# Altium footprint library UserLibrary.PcbLib: 41 footprints (part 1 of 3)
Each footprint in its own frame and in the unit in brackets; x right, y up, seen from the top. Pads: shape width x height; smd on the part's side, far side on the other; paste and mask are expansions set on the pad; w line width, h text height; cw(c..) or ccw(c..) is an arc to the next point about the centre after c.
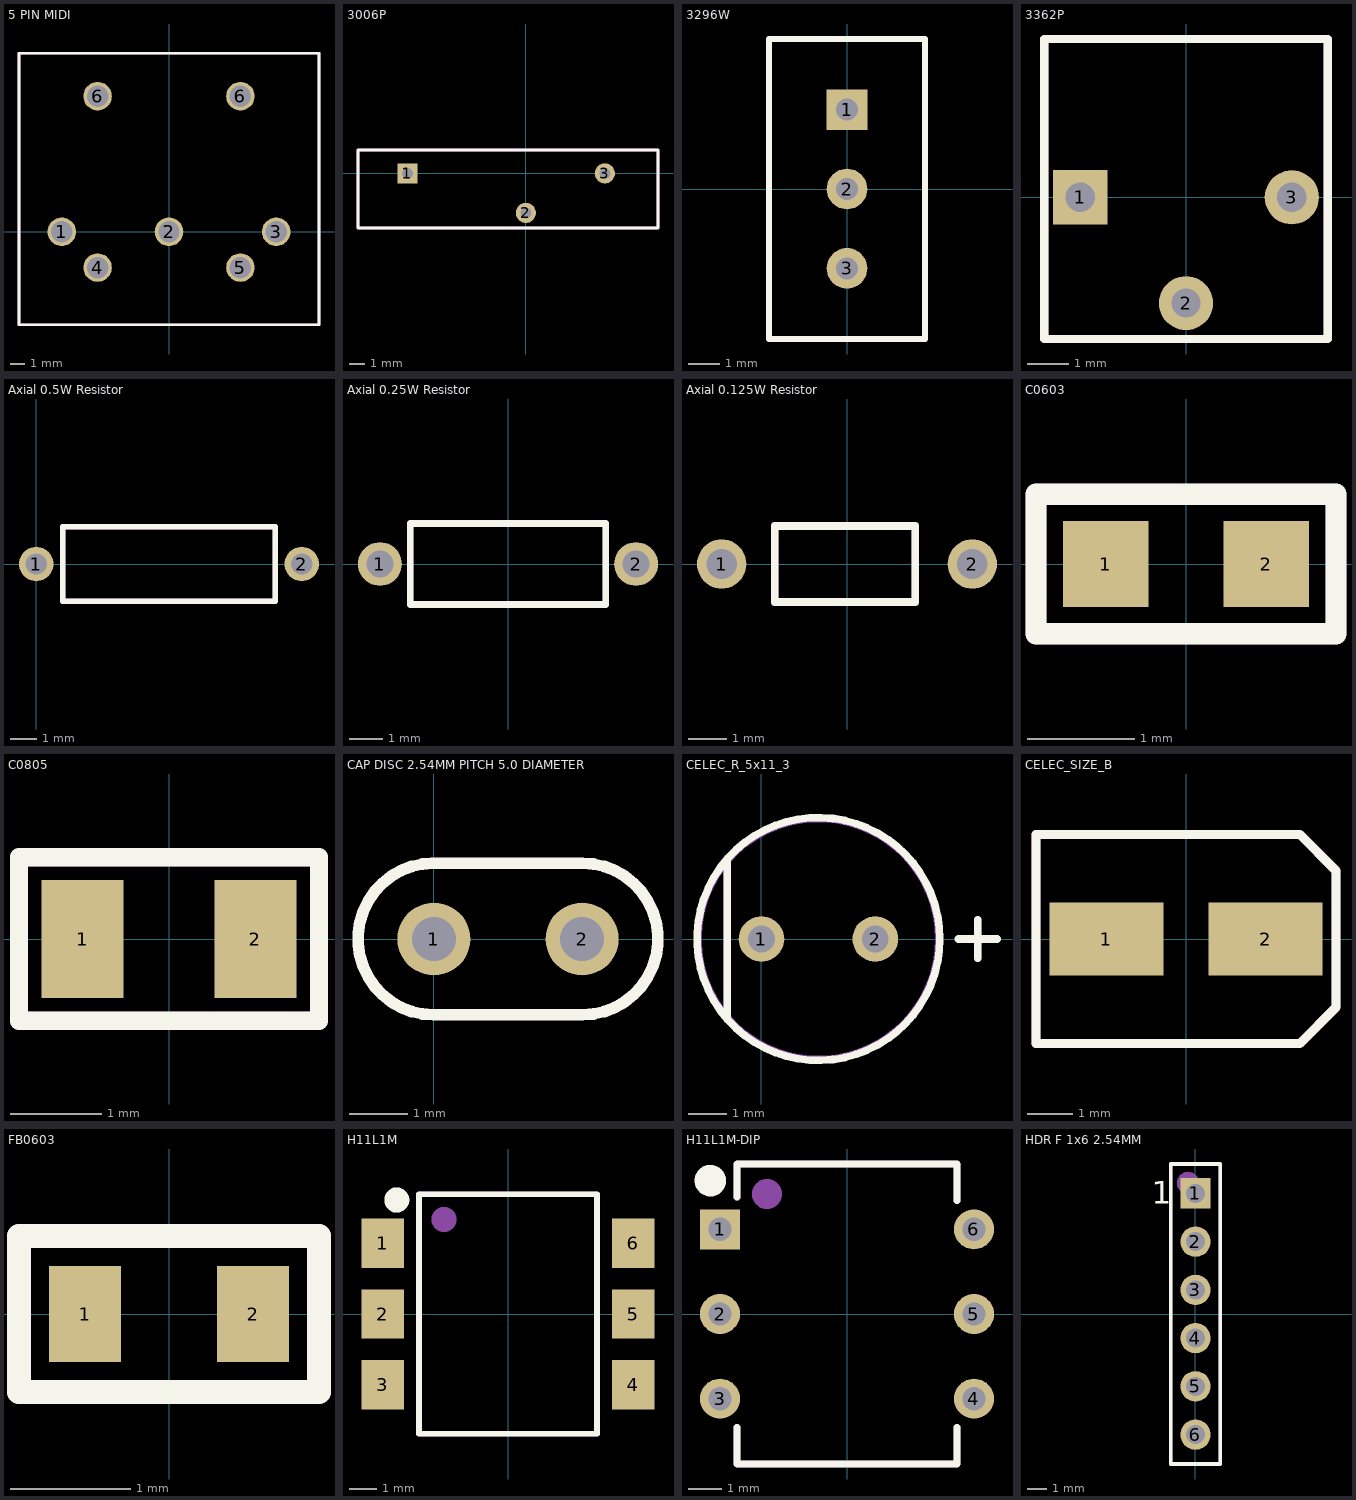
[diagram p0: the footprints below, top view; thin cyan lines are the x and y axes]

## 5 PIN MIDI [mm]
pads (7):
  round 2 hole 1.5: 1(-7.5,0) 2(0,0) 3(7.5,0) 4(-5,-2.5) 5(5,-2.5) 6(-5,9.5) 6(5,9.5)
Top Overlay:
  lines w0.2: -10.5,-6.5 -10.5,12.5 10.5,12.5 10.5,-6.5 -10.5,-6.5
Mechanical 29:
  lines w0.2: -10.5,-6.5 -10.5,12.5 10.5,12.5 10.5,-6.5 -10.5,-6.5
  text ".Designator" at -3.3,3.1 h1.2
3D body "DIN-5.STEP": height 19.51, standoff -2.79, extent -10.6,-6.514 10.6,12.5

## 3006P [mm]
pads (3):
  rect 1.3x1.3 hole 0.7: 1(-7.62,0)
  round 1.3 hole 0.7: 2(0,-2.54) 3(5.08,0)
Top Overlay:
  lines w0.2: -10.8,-3.5 8.5,-3.5 8.5,1.5 -10.8,1.5 -10.8,-3.5
Mechanical 29:
  lines w0.2: -10.8,-3.5 -10.8,1.5 8.5,1.5 8.5,-3.5 -10.8,-3.5
  text ".Designator" at -4.5,-1.2 h1.2
3D body "3006P.step": height 6.36, standoff -1.89, extent -10.665,-3.43 9.905,1.4

## 3296W [mm]
pads (3):
  rect 1.3x1.3 hole 0.7: 1(0,2.54)
  round 1.3 hole 0.7: 2(0,0) 3(0,-2.54)
Top Overlay:
  lines w0.2: -2.5,-4.8 2.5,-4.8 2.5,4.8 -2.5,4.8 -2.5,-4.8
Mechanical 29:
  lines w0.2: -2.5,-4.8 -2.5,4.8 2.5,4.8 2.5,-4.8 -2.5,-4.8
  text ".Designator" at 0.6,-2.3 h1.2
3D body "3296W.STEP": height 11.56, standoff -7.61, extent -2.415,-4.765 2.415,4.765

## 3362P [mm]
pads (3):
  rect 1.3x1.3 hole 0.7: 1(-2.54,0)
  round 1.3 hole 0.7: 2(0,-2.54) 3(2.54,0)
Top Overlay:
  lines w0.2: -3.4,-3.4 3.4,-3.4 3.4,3.8 -3.4,3.8 -3.4,-3.4
Mechanical 29:
  lines w0.2: -3.4,-3.4 -3.4,3.8 3.4,3.8 3.4,-3.4 -3.4,-3.4
  text ".Designator" at 0.6,-2.3 h1.2
3D body "3362P.STEP": height 4.7, standoff -5.47, extent -3.3,-3.3 3.3,3.754

## Axial 0.5W Resistor [mm]
pads (2):
  round 1.3 hole 0.8: 1(0,0) 2(10,0)
Top Overlay:
  lines w0.2: 1,-1.4 9,-1.4 9,1.4 1,1.4 1,-1.4
Mechanical 29:
  lines w0.2: 1,-1.4 1,1.4 9,1.4 9,-1.4 1,-1.4
  text ".Designator" at 3.4,-0.5 h1.2
3D body "RESAD1000W56L850D270-000-300_SEI_CF12.STEP": height 2.7, standoff -3, extent -0.28,-1.35 10.28,1.35

## Axial 0.25W Resistor [mm]
pads (2):
  round 1.3 hole 0.8: 1(-3.8,0) 2(3.8,0)
Top Overlay:
  lines w0.2: -2.9,-1.2 -2.9,1.2 2.9,1.2 2.9,-1.2 -2.9,-1.2
Mechanical 29:
  lines w0.2: -2.9,-1.2 -2.9,1.2 2.9,1.2 2.9,-1.2 -2.9,-1.2
  text ".Designator" at -2,-0.6 h1.2
3D body "R-Axial-0_25W-7_62.step": height 2.5, standoff -3.7, extent -4.11,-1.203 4.11,1.203

## Axial 0.125W Resistor [mm]
pads (2):
  round 1.3 hole 0.8: 1(-3.3,0) 2(3.3,0)
Top Overlay:
  lines w0.2: -1.9,-1 1.8,-1 1.8,1 -1.9,1 -1.9,-1
Mechanical 29:
  lines w0.2: -1.9,-1 1.8,-1 1.8,1 -1.9,1 -1.9,-1
  text ".Designator" at -2,-0.6 h1.2
3D body "RES-AXIAL-L3.6-D1.9-DA0.5-Pitch6.6-Blue.step": height 1.95, standoff -3, extent -3.55,-0.948 3.55,0.948

## C0603 [mm]
pads (2):
  rect 0.8x0.8 smd: 1(-0.75,0) 2(0.75,0)
Top Overlay:
  lines w0.2: -1.4,-0.65 -1.4,0.65 1.4,0.65 1.4,-0.65 -1.4,-0.65
Mechanical 29:
  lines w0.2: -1.4,-0.65 1.4,-0.65 1.4,0.65 -1.4,0.65 -1.4,-0.65
  text ".Designator" at -0.925,-0.275 h0.6
3D body "CAPC1608X95N EIA 0603.step": height 0.96, standoff 0.01, extent -0.8,-0.4 0.8,0.4

## C0805 [mm]
pads (2):
  rect 0.9x1.3 smd: 1(-0.95,0) 2(0.95,0)
Top Overlay:
  lines w0.2: -1.65,-0.9 1.65,-0.9 1.65,0.9 -1.65,0.9 -1.65,-0.9
Mechanical 29:
  lines w0.2: -1.65,-0.9 -1.65,0.9 1.65,0.9 1.65,-0.9 -1.65,-0.9
  text ".Designator" at -0.9,-0.2 h0.6
3D body "CAPC2012X90N EIA 0805.step": height 0.91, standoff 0.01, extent -1,-0.6 1,0.6

## CAP DISC 2.54MM PITCH 5.0 DIAMETER [mm]
pads (2):
  round 1.25 hole 0.75: 1(0,0) 2(2.54,0)
Top Overlay:
  lines w0.2: -0.04,1.3 2.5,1.3 ; 0,1.3 ccw(c0,0) 0,-1.3 2.54,-1.3 ccw(c2.54,0) 2.54,1.3
Mechanical 29:
  text ".Designator" at -0.5,-1.1 h1.2
3D body "Ceramic Disc 2.54 pitch 4.5 diameter.STEP": height 4.57, standoff -3, extent -0.898,-1.03 3.498,1.049

## CELEC_R_5x11_3 [mm]
pads (2):
  round 1.2 hole 0.7: 1(0,0) 2(3,0)
Top Overlay:
  circle w0.2: c1.5,0 r3.2
  lines w0.2: -0.9,-2.1 -0.9,2.1 ; 5.192,0 6.208,0 ; 5.7,-0.508 5.7,0.508
Mechanical 29:
  circle w0.2: c1.5,0 r3.178
  lines w0.2: -0.9,-2 -0.9,2 ; 5.2,0 6.2,0 ; 5.7,-0.5 5.7,0.5
  text ".Designator" at 0.9,-1.2 h1.2
3D body "Cap-EL(6_3x12-2_5).step": height 12, standoff -3.2, extent -1.652,-3.149 4.65,3.149

## CELEC_SIZE_B [mm]
pads (2):
  rect 2.5x1.6 smd: 1(-1.75,0) 2(1.75,0)
Top Overlay:
  lines w0.2: -3.3,-2.3 2.5,-2.3 3.3,-1.5 3.3,1.5 2.5,2.3 -3.3,2.3 -3.3,-2.3
Mechanical 29:
  lines w0.2: -3.3,-2.3 2.5,-2.3 3.3,-1.5 3.3,1.5 2.5,2.3 -3.3,2.3 -3.3,-2.3
  text ".Designator" at -1.9,-0.6 h1.2
3D body "CELEC_SIZE_B.stp": height 5.81, standoff 0.01, extent -2.5,-2.15 2.5,2.15

## FB0603 [mm]
pads (2):
  rect 0.6x0.8 smd: 1(-0.7,0) 2(0.7,0)
Top Overlay:
  lines w0.2: -1.25,-0.65 1.25,-0.65 1.25,0.65 -1.25,0.65 -1.25,-0.65
Mechanical 29:
  lines w0.2: -1.25,-0.65 1.25,-0.65 1.25,0.65 -1.25,0.65 -1.25,-0.65
  text ".Designator" at -0.7,-0.275 h0.6
3D body "FB0603.stp": height 0.81, standoff 0.01, extent -0.8,-0.4 0.8,0.4

## H11L1M [mm]
pads (6):
  rect 1.52x1.78 smd: 1(-4.505,2.54) 2(-4.505,0) 3(-4.505,-2.54) 4(4.505,-2.54) 5(4.505,0) 6(4.505,2.54)
Top Overlay:
  circle w0.5: c-4,4.1 r0.2
  lines w0.2: -3.2,-4.3 -3.2,4.3 3.2,4.3 3.2,-4.3 -3.2,-4.3
Mechanical 29:
  circle w0.5: c-2.3,3.4 r0.2
  lines w0.2: -3.2,-4.3 -3.2,4.3 3.2,4.3 3.2,-4.3 -3.2,-4.3
  text ".Designator" at -1.7,-0.6 h1.2
3D body "H11L1M.STEP": height 5.15, standoff -0.07, extent -4.966,-4.496 4.966,4.484

## H11L1M-DIP [mm]
pads (6):
  rect 1.2x1.2 hole 0.7: 1(-3.81,2.54)
  round 1.2 hole 0.7: 2(-3.81,0) 3(-3.81,-2.54) 4(3.81,-2.54) 5(3.81,0) 6(3.81,2.54)
Top Overlay:
  circle w0.5: c-4.1,4 r0.224
  lines w0.2: -3.3,-3.4 -3.3,-4.5 3.3,-4.5 3.3,-3.4 ; -3.3,3.5 -3.3,4.5 3.3,4.5 3.3,3.4
Mechanical 29:
  circle w0.5: c-2.4,3.6 r0.2
  lines w0.2: -3.3,-3.4 -3.3,-4.5 3.3,-4.5 3.3,-3.4 ; -3.3,3.5 -3.3,4.5 3.3,4.5 3.3,3.4
  text ".Designator" at -2.2,-1 h1.2
3D body "DIP6-White.step": height 4.38, standoff -3.12, extent -3.935,-4.45 3.935,4.45

## HDR F 1x6 2.54MM [mm]
pads (6):
  rect 1.6x1.6 hole 1: 1(0,6.35)
  round 1.6 hole 1: 2(0,3.81) 3(0,1.27) 4(0,-1.27) 5(0,-3.81) 6(0,-6.35)
Top Overlay:
  lines w0.2: -1.3,-7.9 1.3,-7.9 1.3,7.9 -1.3,7.9 -1.3,-7.9
  text "1" at -2.3,5.8 h1.2
Mechanical 29:
  circle w0.6: c-0.4,6.9 r0.283
  lines w0.2: -1.3,-7.9 -1.3,7.9 1.3,7.9 1.3,-7.9 -1.3,-7.9
  text ".Designator" at 0.6,-3.7 h1.2
3D body "HEADER_6PINS_FEM.STEP": height 8.51, standoff -2.99, extent -1.27,-7.87 1.27,7.87